# Altium footprint library Blue Tractor-2021.PcbLib: 82 footprints (part 3 of 6)
Each footprint in its own frame and in the unit in brackets; x right, y up, seen from the top. Pads: shape width x height; smd on the part's side, far side on the other; paste and mask are expansions set on the pad; w line width, h text height; cw(c..) or ccw(c..) is an arc to the next point about the centre after c.
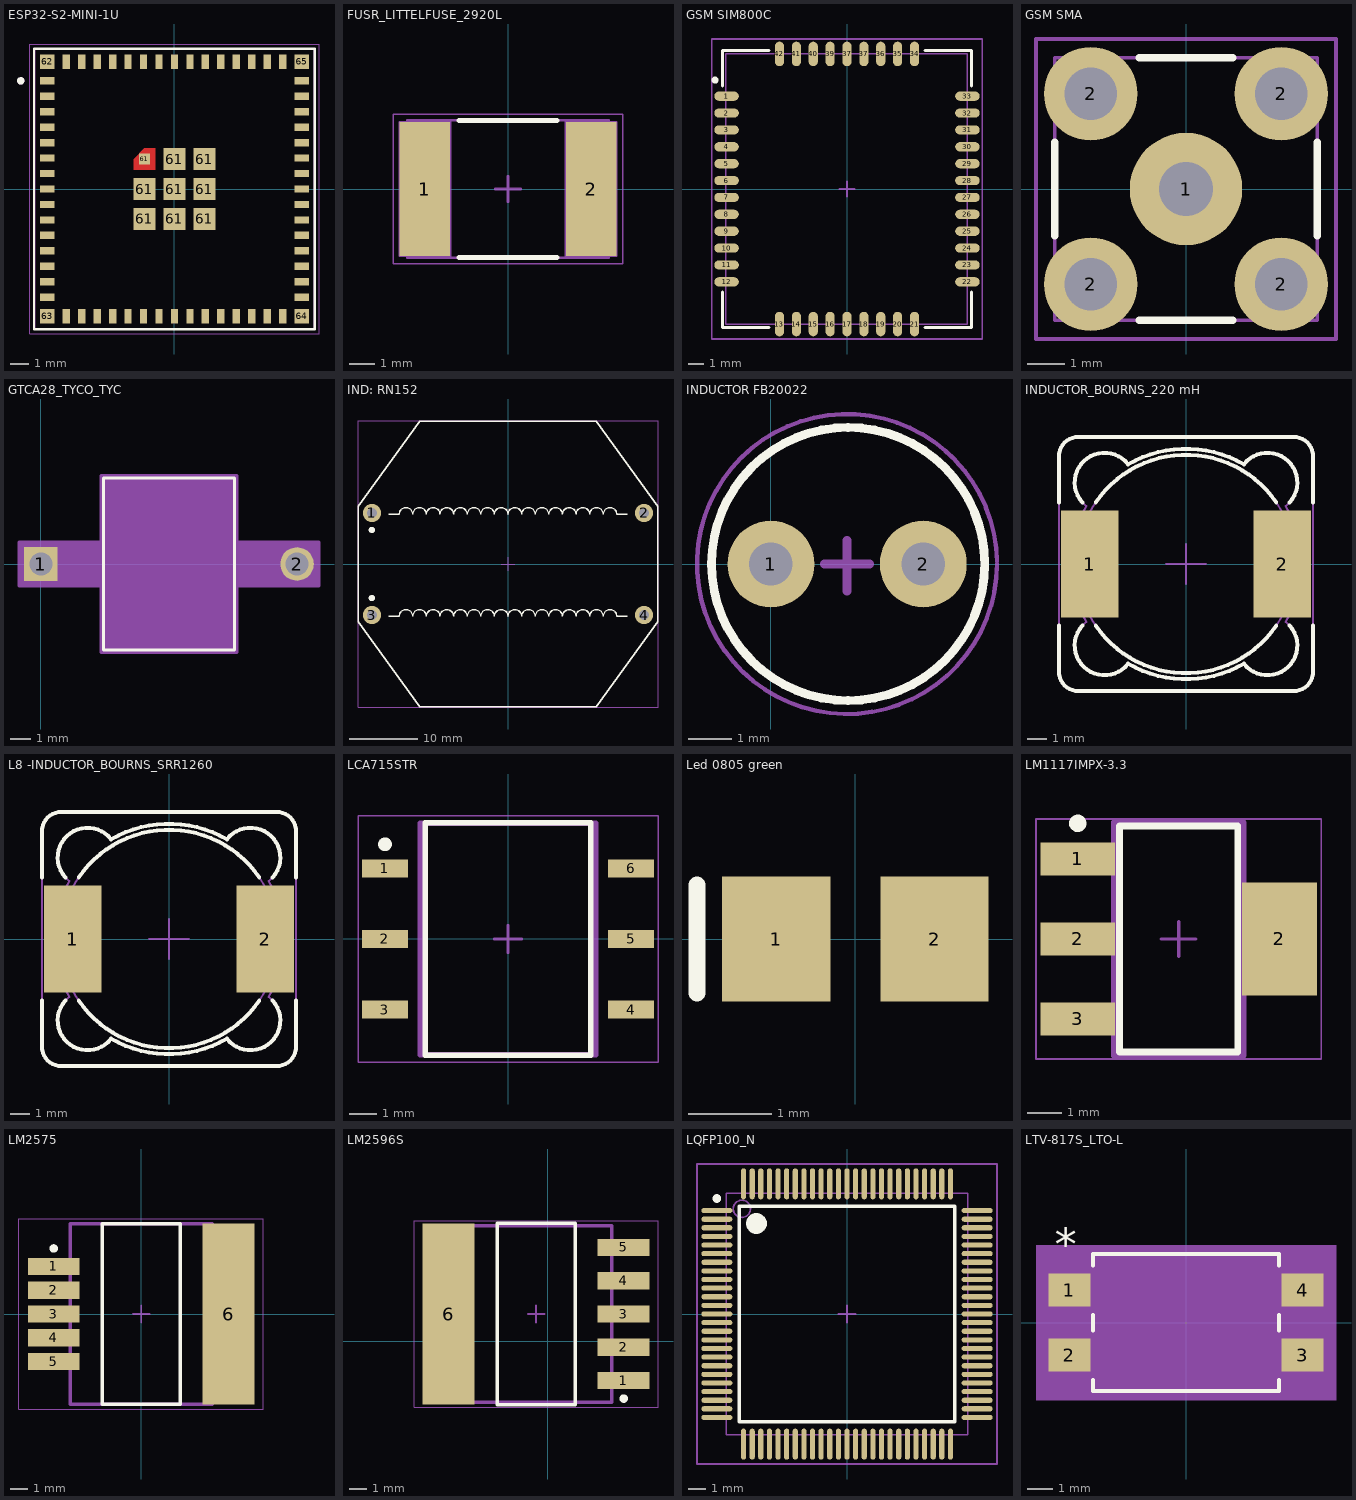
[diagram p2: the footprints below, top view; thin cyan lines are the x and y axes]

## ESP32-S2-MINI-1U [mm] "SMD MODULE, ESP32-S2FN4R2 WITH 4"
height 2.5
pads (73):
  rect 0.8x0.4 smd: 1(-7,5.95) 2(-7,5.1) 3(-7,4.25) 4(-7,3.4) 5(-7,2.55) 6(-7,1.7) 7(-7,0.85) 8(-7,0) 9(-7,-0.85) 10(-7,-1.7) 11(-7,-2.55) 12(-7,-3.4) 13(-7,-4.25) 14(-7,-5.1) 15(-7,-5.95) 31(7,-5.95) 32(7,-5.1) 33(7,-4.25) 34(7,-3.4) 35(7,-2.55) 36(7,-1.7) 37(7,-0.85) 38(7,0) 39(7,0.85) 40(7,1.7) 41(7,2.55) 42(7,3.4) 43(7,4.25) 44(7,5.1) 45(7,5.95)
  rect 0.4x0.8 smd: 16(-5.95,-7) 17(-5.1,-7) 18(-4.25,-7) 19(-3.4,-7) 20(-2.55,-7) 21(-1.7,-7) 22(-0.85,-7) 23(0,-7) 24(0.85,-7) 25(1.7,-7) 26(2.55,-7) 27(3.4,-7) 28(4.25,-7) 29(5.1,-7) 30(5.95,-7) 46(5.95,7) 47(5.1,7) 48(4.25,7) 49(3.4,7) 50(2.55,7) 51(1.7,7) 52(0.85,7) 53(0,7) 54(-0.85,7) 55(-1.7,7) 56(-2.55,7) 57(-3.4,7) 58(-4.25,7) 59(-5.1,7) 60(-5.95,7)
  rect 1.2x1.2 smd: 61(-1.65,-1.65) 61(-1.65,0) 61(0,-1.65) 61(0,0) 61(0,1.65) 61(1.65,-1.65) 61(1.65,0) 61(1.65,1.65)
  rect 0.6x0.6 smd paste-1 mask+0: 61(-1.65,1.65)
  rect 0.8x0.8 smd: 62(-7,7) 63(-7,-7) 64(7,-7) 65(7,7)
Top Layer:
  region: -1.05,1.05 -2.25,1.05 -2.25,1.65 -1.65,2.25 -1.05,2.25
Top Overlay:
  circle w0.2: c-8.45,5.95 r0.1
  lines w0.127: -7.72,-7.72 7.72,-7.72 7.72,7.72 -7.72,7.72 -7.72,-7.72
Top Paste:
  region: -1.05,1.05 -2.25,1.05 -2.25,1.65 -1.65,2.25 -1.05,2.25
Top Solder:
  region: -0.95,0.95 -2.35,0.95 -2.35,1.7 -1.7,2.35 -0.95,2.35
Mechanical 13:
  circle w0.2: c-8.45,5.95 r0.1
  lines w0.127: -7.7,-7.7 7.7,-7.7 7.7,7.7 -7.7,7.7 -7.7,-7.7
Mechanical 15:
  lines w0.05: -7.95,-7.95 7.95,-7.95 7.95,7.95 -7.95,7.95 -7.95,-7.95
  lines w0.1: -0.5,0 0.5,0 ; 0,-0.5 0,0.5
3D body "step_temp.STEP": height 2.55, standoff 0, extent -7.7,-7.7 7.7,7.7

## FUSR_LITTELFUSE_2920L [mm] "Surface Mount POLY-FUSE® Resettable PTC, Body 7.355 x 5.12mm, 2920L Series"
height 1.8
pads (2):
  rect 2x5.3 smd: 1(-3.3,0) 2(3.3,0)
Top Overlay:
  lines w0.2: -1.95,-2.72 1.95,-2.72 ; -1.95,2.72 1.95,2.72
Mechanical 8:
  lines w0.1: -3.8,0 -3.3,0 ; -3.3,-0.5 -3.3,0 ; -3.3,0.5 -3.3,0 ; -2.8,0 -3.3,0 ; -0.5,0 0,0 ; 0,-0.5 0,0 ; 0,0.5 0,0 ; 0.5,0 0,0 ; 2.8,0 3.3,0 ; 3.3,-0.5 3.3,0 ; 3.3,0.5 3.3,0 ; 3.8,0 3.3,0 ; -4.3,-2.65 -4.3,2.65 -2.3,2.65 -2.3,-2.65 -4.3,-2.65 ; 2.3,-2.65 4.3,-2.65 4.3,2.65 2.3,2.65 2.3,-2.65
Mechanical 14:
  lines w0.1: -3.99,-2.72 3.99,-2.72 3.99,2.72 -3.99,2.72 -3.99,-2.72
Mechanical 15:
  lines w0.05: -4.55,-2.97 4.55,-2.97 4.55,2.97 -4.55,2.97 -4.55,-2.97
3D body "FUSR_LITTELFUSE_2920L.stp": height 1.8, standoff 0, extent -3.99,-2.72 3.99,2.72

## GSM SIM800C [mm]
height 2.8
pads (42):
  oval 1.6x0.6 smd: 1(-7.85,6.05) 2(-7.85,4.95) 3(-7.85,3.85) 4(-7.85,2.75) 5(-7.85,1.65) 6(-7.85,0.55) 7(-7.85,-0.55) 8(-7.85,-1.65) 9(-7.85,-2.75) 10(-7.85,-3.85) 11(-7.85,-4.95) 12(-7.85,-6.05) 22(7.85,-6.05) 23(7.85,-4.95) 24(7.85,-3.85) 25(7.85,-2.75) 26(7.85,-1.65) 27(7.85,-0.55) 28(7.85,0.55) 29(7.85,1.65) 30(7.85,2.75) 31(7.85,3.85) 32(7.85,4.95) 33(7.85,6.05)
  oval 0.6x1.6 smd: 13(-4.4,-8.8) 14(-3.3,-8.8) 15(-2.2,-8.8) 16(-1.1,-8.8) 17(0,-8.8) 18(1.1,-8.8) 19(2.2,-8.8) 20(3.3,-8.8) 21(4.4,-8.8) 34(4.4,8.8) 35(3.3,8.8) 36(2.2,8.8) 37(0,8.8) 37(1.1,8.8) 39(-1.1,8.8) 40(-2.2,8.8) 41(-3.3,8.8) 42(-4.4,8.8)
Top Overlay:
  circle w0.254: c-8.6,7.1 r0.1
  lines w0.2: -8.099,-6.7 -8.099,-9.012 -5.1,-9.012 ; -8.099,6.7 -8.099,9.012 -5.1,9.012 ; 5.1,-9.012 8.099,-9.012 8.099,-6.7 ; 5.1,9.012 8.099,9.012 8.099,6.7
Mechanical 13:
  lines w0.1: -7.9,-8.8 -7.9,8.8 7.85,8.8 7.85,-8.8 -7.9,-8.8
Mechanical 15:
  lines w0.1: -0.5,0 0.5,0 ; 0,-0.5 0,0.5 ; -8.825,-9.775 -8.825,9.775 8.825,9.775 8.825,-9.775 -8.825,-9.775
3D body "User Library-SIM800C-1.STEP": height 2.37, standoff 0.03, extent -7.85,-8.8 7.85,8.8

## GSM SMA [mm]
pads (5):
  round 3 hole 1.45: 1(0,0)
  round 2.5 hole 1.4: 2(-2.54,-2.54) 2(-2.54,2.54) 2(2.54,-2.54) 2(2.54,2.54)
Top Overlay:
  lines w0.2: -3.5,-1.25 -3.5,1.25 ; -1.25,-3.5 1.25,-3.5 ; -1.25,3.5 1.25,3.5 ; 3.5,-1.25 3.5,1.25
Mechanical 1:
  lines w0.1: -3.5,-3.5 -3.5,3.5 3.5,3.5 3.5,-3.5 -3.5,-3.5
Mechanical 15:
  lines w0.1: -0.5,0 0.5,0 ; 0,-0.5 0,0.5 ; -4,-4 4,-4 4,4 -4,4 -4,-4
3D body "SMA_connector.STEP": height 9.53, standoff -3.94, extent -3.5,-3.5 3.5,3.5

## GTCA28_TYCO_TYC [mil]
pads (2):
  rect 65x65 hole 45 mask+0: 1(0,0)
  round 65 hole 45 mask+0: 2(496.1,0)
Top Overlay:
  lines w6: 121.05,-166.5 375.05,-166.5 375.05,166.5 121.05,166.5 121.05,-166.5
Mechanical 13:
  lines w1: 0,0 126.05,0 ; 370.05,0 496.1,0 ; 126.05,-161.5 370.05,-161.5 370.05,161.5 126.05,161.5 126.05,-161.5
Mechanical 15:
  region: 116.05,-42.5 -42.5,-42.5 -42.5,42.5 116.05,42.5 116.05,171.5 380.05,171.5 380.05,42.5 538.6,42.5 538.6,-42.5 380.05,-42.5 380.05,-171.5 116.05,-171.5
  lines w6: -42.5,-42.5 -42.5,42.5 116.05,42.5 116.05,171.5 380.05,171.5 380.05,42.5 538.6,42.5 538.6,-42.5 380.05,-42.5 380.05,-171.5 116.05,-171.5 116.05,-42.5 -42.5,-42.5
3D body "RES_GTCA28_TYCO_TYC.step": height 323, standoff -100, extent -17.48,-161.5 513.58,161.5

## IND: RN152 [mm] "2 Line Common Mode Choke Through Hole Filter"
height 25
pads (4):
  round 2.7 hole 1.5: 1(-20,7.5) 2(20,7.5) 3(-20,-7.5) 4(20,-7.5)
Top Overlay:
  circle w0.5: c-20,5 r0.224
  circle w0.5: c-20,-5 r0.224
  lines w0.2: -17.5,-7.7 -16,-7.7 cw(c-15,-7.7) -14,-7.7 cw(c-13,-7.7) -12,-7.7 cw(c-11,-7.7) -10,-7.7 cw(c-9,-7.7) -8,-7.7 cw(c-7,-7.7) -6,-7.7 cw(c-5,-7.7) -4,-7.7 cw(c-3,-7.7) -2,-7.7 cw(c-1,-7.7) 0,-7.7 cw(c1,-7.7) 2,-7.7 cw(c3,-7.7) 4,-7.7 cw(c5,-7.7) 6,-7.7 cw(c7,-7.7) 8,-7.7 cw(c9,-7.7) 10,-7.7 cw(c11,-7.7) 12,-7.7 cw(c13,-7.7) 14,-7.7 cw(c15,-7.7) 16,-7.7 17.5,-7.7 ; -17.5,7.3 -16,7.3 cw(c-15,7.3) -14,7.3 cw(c-13,7.3) -12,7.3 cw(c-11,7.3) -10,7.3 cw(c-9,7.3) -8,7.3 cw(c-7,7.3) -6,7.3 cw(c-5,7.3) -4,7.3 cw(c-3,7.3) -2,7.3 cw(c-1,7.3) 0,7.3 cw(c1,7.3) 2,7.3 cw(c3,7.3) 4,7.3 cw(c5,7.3) 6,7.3 cw(c7,7.3) 8,7.3 cw(c9,7.3) 10,7.3 cw(c11,7.3) 12,7.3 cw(c13,7.3) 14,7.3 cw(c15,7.3) 16,7.3 17.5,7.3 ; -22,-8.5 -22,8.5 -13,21 13,21 22,8.5 22,-8.5 13,-21 -13,-21 -22,-8.5
Mechanical 15:
  lines w0.1: -1,0 1,0 ; 0,-1 0,1 ; -22.05,-21.05 -22.05,21.05 22.05,21.05 22.05,-21.05 -22.05,-21.05
3D body "B82725A_V06_MAX_public-TDK-PC.step": height 23.98, standoff -5.02, extent -22,-21.2 22,21.2

## INDUCTOR FB20022 [mm]
pads (2):
  round 2 hole 1: 1(0,0) 2(3.505,0)
Top Overlay:
  circle w0.2: c1.775,0 r3.143
Mechanical 11:
  lines w0.1: 5.201,0.05 ccw(c1.75,0) 5.201,0
  lines w0.2: 1.225,0 2.275,0 ; 1.75,-0.625 1.75,0.55

## INDUCTOR_BOURNS_220 mH [mm] "SMD Inductor Body Width 12.5mm Body Lenght 12.5mm Height 8mm"
height 8
pads (2):
  rect 2.9x5.4 smd: 1(-4.85,0) 2(4.85,0)
Top Overlay:
  lines w0.2: -6.4,-3.1 -6.4,-5.4 ccw(c-5.4,-5.4) -5.4,-6.4 5.4,-6.4 ccw(c5.4,-5.4) 6.4,-5.4 6.4,-3.1 ; -6.4,3.1 -6.4,5.4 cw(c-5.4,5.4) -5.4,6.4 5.4,6.4 cw(c5.4,5.4) 6.4,5.4 6.4,3.1 ; -5.218,-3.1 ccw(c-4.101,-4.101) -2.912,-5.016 ccw(c0,0) 2.912,-5.016 ccw(c4.101,-4.101) 5.218,-3.1 ; -5.218,3.1 cw(c-4.101,4.101) -2.912,5.016 cw(c0,0) 2.912,5.016 cw(c4.101,4.101) 5.218,3.1 ; -4.543,-3.1 ccw(c0,0) 4.543,-3.1 ; -4.543,3.1 cw(c0,0) 4.543,3.1
Mechanical 8:
  lines w0.1: -5.85,0 -4.85,0 ; -4.85,-1 -4.85,0 ; -4.85,1 -4.85,0 ; -3.85,0 -4.85,0 ; -1,0 0,0 ; 0,-1 0,0 ; 0,1 0,0 ; 1,0 0,0 ; 3.85,0 4.85,0 ; 4.85,-1 4.85,0 ; 4.85,1 4.85,0 ; 5.85,0 4.85,0
Mechanical 14:
  circle w0.1: c0,0 r5.5
  lines w0.1: -6.4,-5.4 ccw(c-5.4,-5.4) -5.4,-6.4 5.4,-6.4 ccw(c5.4,-5.4) 6.4,-5.4 6.4,5.4 ccw(c5.4,5.4) 5.4,6.4 -5.4,6.4 ccw(c-5.4,5.4) -6.4,5.4 -6.4,-5.4 ; -5.016,-2.912 cw(c0,0) -5.016,2.912 cw(c-4.101,4.101) -2.912,5.016 cw(c0,0) 2.912,5.016 cw(c4.101,4.101) 5.016,2.912 cw(c0,0) 5.016,-2.912 cw(c4.101,-4.101) 2.912,-5.016 cw(c0,0) -2.912,-5.016 cw(c-4.101,-4.101) -5.016,-2.912
3D body "IND_BOURNS_PM127SH.stp": height 8, standoff 0, extent -6.4,-6.4 6.4,6.4

## L8 -INDUCTOR_BOURNS_SRR1260 [mm] "SMD Inductor Body Width 12.5mm Body Lenght 12.5mm Height 6.5mm"
height 6.5
pads (2):
  rect 2.9x5.4 smd: 1(-4.85,0) 2(4.85,0)
Top Overlay:
  lines w0.2: -6.4,-3.1 -6.4,-5.4 ccw(c-5.4,-5.4) -5.4,-6.4 5.4,-6.4 ccw(c5.4,-5.4) 6.4,-5.4 6.4,-3.1 ; -6.4,3.1 -6.4,5.4 cw(c-5.4,5.4) -5.4,6.4 5.4,6.4 cw(c5.4,5.4) 6.4,5.4 6.4,3.1 ; -5.218,-3.1 ccw(c-4.101,-4.101) -2.912,-5.016 ccw(c0,0) 2.912,-5.016 ccw(c4.101,-4.101) 5.218,-3.1 ; -5.218,3.1 cw(c-4.101,4.101) -2.912,5.016 cw(c0,0) 2.912,5.016 cw(c4.101,4.101) 5.218,3.1 ; -4.543,-3.1 ccw(c0,0) 4.543,-3.1 ; -4.543,3.1 cw(c0,0) 4.543,3.1
Mechanical 8:
  lines w0.1: -5.85,0 -4.85,0 ; -4.85,-1 -4.85,0 ; -4.85,1 -4.85,0 ; -3.85,0 -4.85,0 ; -1,0 0,0 ; 0,-1 0,0 ; 0,1 0,0 ; 1,0 0,0 ; 3.85,0 4.85,0 ; 4.85,-1 4.85,0 ; 4.85,1 4.85,0 ; 5.85,0 4.85,0
Mechanical 14:
  circle w0.1: c0,0 r5.5
  lines w0.1: -6.4,-5.4 ccw(c-5.4,-5.4) -5.4,-6.4 5.4,-6.4 ccw(c5.4,-5.4) 6.4,-5.4 6.4,5.4 ccw(c5.4,5.4) 5.4,6.4 -5.4,6.4 ccw(c-5.4,5.4) -6.4,5.4 -6.4,-5.4 ; -5.016,-2.912 cw(c0,0) -5.016,2.912 cw(c-4.101,4.101) -2.912,5.016 cw(c0,0) 2.912,5.016 cw(c4.101,4.101) 5.016,2.912 cw(c0,0) 5.016,-2.912 cw(c4.101,-4.101) 2.912,-5.016 cw(c0,0) -2.912,-5.016 cw(c-4.101,-4.101) -5.016,-2.912
3D body "IND_BOURNS_SRR1260.stp": height 6.5, standoff 0, extent -6.4,-6.4 6.4,6.4

## LCA715STR [mm] "SOT23, 6 Pin Surface Mount (1000/Reel)"
height 4.45
pads (6):
  rect 1.65x0.65 smd: 1(-4.45,2.55) 2(-4.45,0) 3(-4.45,-2.55) 4(4.45,-2.55) 5(4.45,0) 6(4.45,2.55)
Top Overlay:
  circle w0.25: c-4.45,3.425 r0.125
  lines w0.2: -3,-4.2 3,-4.2 3,4.2 -3,4.2 -3,-4.2
Mechanical 13:
  lines w0.2: -3.175,-4.19 -3.175,4.19 3.175,4.19 3.175,-4.19 -3.175,-4.19
Mechanical 15:
  lines w0.05: -5.425,-4.45 -5.425,4.45 5.425,4.45 5.425,-4.45 -5.425,-4.45
  lines w0.1: -0.5,0 0.5,0 ; 0,-0.5 0,0.5
3D body: height 4.45, standoff 1.14, extent -3.175,-4.19 3.175,4.19

## Led 0805 green [mm] "Body 2.0 x 1.2 mm (LxW typ)"
height 1.3
pads (2):
  rect 1.3x1.5 smd: 1(-0.95,0) 2(0.95,0)
Top Overlay:
  lines w0.2: -1.9,-0.65 -1.9,0.65
3D body "led_0805_green.step": height 1.1, standoff 0, extent -1.01,-0.625 1.01,0.625

## LM1117IMPX-3.3 [mm] "SOT 223"
height 1.8
pads (4):
  rect 2.15x0.95 smd: 1(-14.5,11.5) 2(-14.5,9.2) 3(-14.5,6.9)
  rect 2.15x3.25 smd: 2(-8.7,9.2)
Top Overlay:
  circle w0.25: c-14.5,12.525 r0.125
  lines w0.2: -13.3,5.95 -13.3,12.45 -9.9,12.45 -9.9,5.95 -13.3,5.95
Mechanical 13:
  lines w0.2: -13.45,5.85 -13.45,12.55 -9.75,12.55 -9.75,5.85 -13.45,5.85
Mechanical 15:
  lines w0.05: -15.7,5.75 -15.7,12.65 -7.5,12.65 -7.5,5.75 -15.7,5.75
  lines w0.1: -12.1,9.2 -11.1,9.2 ; -11.6,8.7 -11.6,9.7
3D body "LM1117IMPX-3.3.step": height 1.8, standoff 0, extent -15.1,5.85 -8.1,12.55

## LM2575 [mm] "D2PAK  D2T SUFFIX  CASE 936A_6 pin"
height 4.45
pads (6):
  rect 3.05x1.016 smd: 1(-5.152,2.804) 2(-5.152,1.402) 3(-5.152,0) 4(-5.152,-1.402) 5(-5.152,-2.804)
  rect 3.05x10.66 smd: 6(5.153,0)
Top Overlay:
  circle w0.25: c-5.152,3.862 r0.125
  lines w0.2: -2.295,-5.33 2.295,-5.33 2.295,5.33 -2.295,5.33 -2.295,-5.33
Mechanical 13:
  lines w0.2: -4.19,-5.33 4.19,-5.33 4.19,5.33 -4.19,5.33 -4.19,-5.33
Mechanical 15:
  lines w0.05: -7.2,-5.6 7.2,-5.6 7.2,5.6 -7.2,5.6 -7.2,-5.6
  lines w0.1: -0.5,0 0.5,0 ; 0,-0.5 0,0.5
3D body: height 4.45, standoff 0, extent -4.19,-5.33 4.19,5.33

## LM2596S [mm] "TO-263 6 Pin"
height 4.55
pads (6):
  rect 3.05x1.016 smd: 1(4.477,-2.32) 2(4.477,-0.36) 3(4.477,1.6) 4(4.477,3.56) 5(4.477,5.52)
  rect 3.05x10.66 smd: 6(-5.828,1.6)
Top Overlay:
  circle w0.25: c4.477,-3.378 r0.125
  lines w0.2: -2.97,-3.73 -2.97,6.93 1.62,6.93 1.62,-3.73 -2.97,-3.73
Mechanical 13:
  lines w0.2: -5.12,-3.605 -5.12,6.805 3.77,6.805 3.77,-3.605 -5.12,-3.605
Mechanical 15:
  lines w0.05: -7.85,-3.9 -7.85,7.1 6.5,7.1 6.5,-3.9 -7.85,-3.9
  lines w0.1: -1.175,1.6 -0.175,1.6 ; -0.675,1.1 -0.675,2.1
3D body: height 4.55, standoff 0.15, extent -5.12,-3.605 3.77,6.805

## LQFP100_N [mm] "Thin QFP, 100-Leads, Body 14x14mm, Pitch 0.5mm, IPC Medium Density"
height 1.6
pads (100):
  oval 1.8x0.3 smd: 1(-7.55,6) 2(-7.55,5.5) 3(-7.55,5) 4(-7.55,4.5) 5(-7.55,4) 6(-7.55,3.5) 7(-7.55,3) 8(-7.55,2.5) 9(-7.55,2) 10(-7.55,1.5) 11(-7.55,1) 12(-7.55,0.5) 13(-7.55,0) 14(-7.55,-0.5) 15(-7.55,-1) 16(-7.55,-1.5) 17(-7.55,-2) 18(-7.55,-2.5) 19(-7.55,-3) 20(-7.55,-3.5) 21(-7.55,-4) 22(-7.55,-4.5) 23(-7.55,-5) 24(-7.55,-5.5) 25(-7.55,-6) 51(7.55,-6) 52(7.55,-5.5) 53(7.55,-5) 54(7.55,-4.5) 55(7.55,-4) 56(7.55,-3.5) 57(7.55,-3) 58(7.55,-2.5) 59(7.55,-2) 60(7.55,-1.5) 61(7.55,-1) 62(7.55,-0.5) 63(7.55,0) 64(7.55,0.5) 65(7.55,1) 66(7.55,1.5) 67(7.55,2) 68(7.55,2.5) 69(7.55,3) 70(7.55,3.5) 71(7.55,4) 72(7.55,4.5) 73(7.55,5) 74(7.55,5.5) 75(7.55,6)
  oval 0.3x1.8 smd: 26(-6,-7.55) 27(-5.5,-7.55) 28(-5,-7.55) 29(-4.5,-7.55) 30(-4,-7.55) 31(-3.5,-7.55) 32(-3,-7.55) 33(-2.5,-7.55) 34(-2,-7.55) 35(-1.5,-7.55) 36(-1,-7.55) 37(-0.5,-7.55) 38(0,-7.55) 39(0.5,-7.55) 40(1,-7.55) 41(1.5,-7.55) 42(2,-7.55) 43(2.5,-7.55) 44(3,-7.55) 45(3.5,-7.55) 46(4,-7.55) 47(4.5,-7.55) 48(5,-7.55) 49(5.5,-7.55) 50(6,-7.55) 76(6,7.55) 77(5.5,7.55) 78(5,7.55) 79(4.5,7.55) 80(4,7.55) 81(3.5,7.55) 82(3,7.55) 83(2.5,7.55) 84(2,7.55) 85(1.5,7.55) 86(1,7.55) 87(0.5,7.55) 88(0,7.55) 89(-0.5,7.55) 90(-1,7.55) 91(-1.5,7.55) 92(-2,7.55) 93(-2.5,7.55) 94(-3,7.55) 95(-3.5,7.55) 96(-4,7.55) 97(-4.5,7.55) 98(-5,7.55) 99(-5.5,7.55) 100(-6,7.55)
Top Overlay:
  circle w0.6: c-5.25,5.25 r0.3
  circle w0.25: c-7.55,6.7 r0.125
  lines w0.2: -6.25,-6.25 6.25,-6.25 6.25,6.25 -6.25,6.25 -6.25,-6.25
Mechanical 13:
  circle w0.1: c-6.1,6.1 r0.5
  lines w0.1: -7,-7 7,-7 7,7 -7,7 -7,-7
Mechanical 15:
  lines w0.1: -0.5,0 0.5,0 ; 0,-0.5 0,0.5 ; -8.7,-8.7 8.7,-8.7 8.7,8.7 -8.7,8.7 -8.7,-8.7
3D body "LQFP-100.step": height 1.6, standoff 0, extent -8,-8 8,8

## LTV-817S_LTO-L [mil]
pads (4):
  rect 65x51 smd paste+0 mask+0: 1(-179.5,50) 2(-179.5,-50) 3(179.5,-50) 4(179.5,50)
Top Overlay:
  lines w6: -143,-87.97 -143,-105.5 143,-105.5 143,-87.97 ; -143,-12.03 -143,12.03 ; -143,87.97 -143,105.5 143,105.5 143,87.97 ; 143,-12.03 143,12.03
  text "*" at -202,96 h50
Mechanical 5:
  region: 231,-119.5 -231,-119.5 -231,119.5 231,119.5
Mechanical 13:
  lines w0: -12,100.5 ccw(c0,100.5) 12,100.5
  lines w1: -206,-75.5 -138,-75.5 -138,-24.5 -206,-24.5 -206,-75.5 ; -206,24.5 -138,24.5 -138,75.5 -206,75.5 -206,24.5 ; -138,-100.5 -138,100.5 138,100.5 138,-100.5 -138,-100.5 ; 138,-75.5 206,-75.5 206,-24.5 138,-24.5 138,-75.5 ; 138,24.5 206,24.5 206,75.5 138,75.5 138,24.5
  text "*" at -135.5,47.5 h50
Mechanical 15:
  region: -142,-79.5 -216,-79.5 -216,79.5 -142,79.5 -142,104.5 142,104.5 142,79.5 216,79.5 216,-79.5 142,-79.5 142,-104.5 -142,-104.5
  lines w6: -216,-79.5 -142,-79.5 -142,-104.5 142,-104.5 142,-79.5 216,-79.5 216,79.5 142,79.5 142,104.5 -142,104.5 -142,79.5 -216,79.5 -216,-79.5
3D body "LTV-817S_LTO.step": height 181.1, standoff 0, extent -205.98,-100.51 205.98,100.51